# Altium footprint library PcbLib1.PcbLib: 1009 footprints (part 10 of 64)
Each footprint in its own frame and in the unit in brackets; x right, y up, seen from the top. Pads: shape width x height; smd on the part's side, far side on the other; paste and mask are expansions set on the pad; w line width, h text height; cw(c..) or ccw(c..) is an arc to the next point about the centre after c.
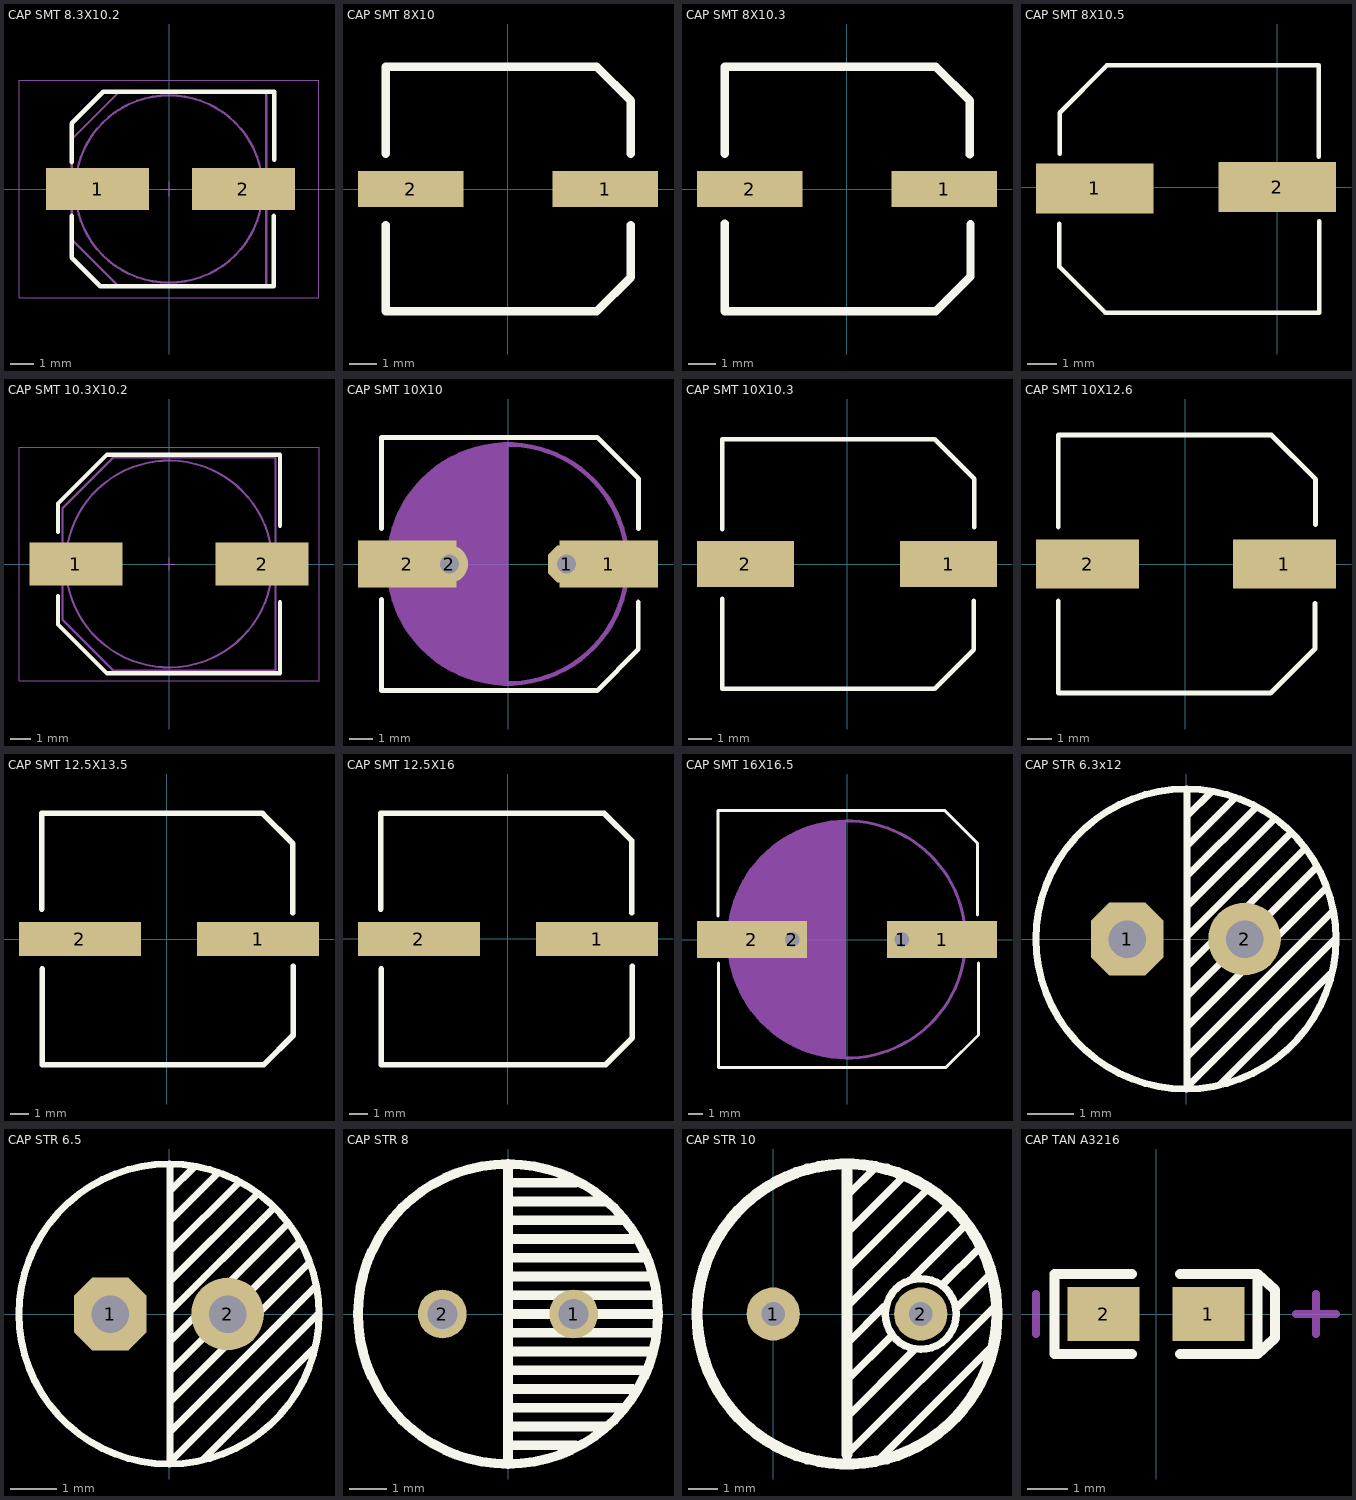
[diagram p9: the footprints below, top view; thin cyan lines are the x and y axes]

## CAP SMT 8.3X10.2 [mm] "Capacitor, Aluminium Electrolytric, 8.3mm L X 8.3mm W X 10.2mm H, IPC Medium Density"
height 10.2
pads (2):
  rect 4.4x1.8 smd: 1(-3.048,0) 2(3.175,0)
Top Overlay:
  lines w0.2: -4.15,-1.15 -4.15,-2.937 -2.937,-4.15 4.47,-4.15 4.47,-1.15 ; -4.15,1.15 -4.15,2.81 -2.81,4.15 4.496,4.15 4.496,1.25
Mechanical 14:
  circle w0.1: c0,0 r4
  lines w0.1: -4.15,-2.15 -4.15,2.124 -2.124,4.15 4.15,4.15 4.15,-4.15 -2.15,-4.15 -4.15,-2.15
Mechanical 15:
  lines w0.05: -0.3,0 0.3,0 ; 0,-0.3 0,0.3 ; -6.4,-4.65 6.4,-4.65 6.4,4.65 -6.4,4.65 -6.4,-4.65
3D body "p440-180.stp": height 0.02, standoff 0, extent 0.985,-0.9 5.385,0.9
3D body "p440-180.stp": height 0.02, standoff 0, extent -5.258,-0.9 -0.858,0.9
3D body "CAPAE830X1020N.stp": height 10.2, standoff 0, extent -4.75,-4.25 5.25,4.25

## CAP SMT 8X10 [mm]
pads (2):
  rect 3.8x1.3 smd: 1(3.5,0) 2(-3.5,0)
Top Overlay:
  lines w0.3: -4.4,-1.295 -4.4,-4.4 3.2,-4.4 4.42,-3.18 4.42,-1.295 ; -4.4,1.27 -4.4,4.4 3.2,4.4 4.42,3.18 4.42,1.27
3D body "3d_8x10-aecap.stp": height 10, standoff 0, extent -4.95,-4.2 4.95,4.2
3D body "p380-130.stp": height 0.02, standoff 0, extent 1.6,-0.65 5.4,0.65
3D body "p380-130.stp": height 0.02, standoff 0, extent -5.4,-0.65 -1.6,0.65

## CAP SMT 8X10.3 [mm]
pads (2):
  rect 3.8x1.3 smd: 1(3.5,0) 2(-3.5,0)
Top Overlay:
  lines w0.3: -4.4,-1.245 -4.4,-4.4 3.2,-4.4 4.445,-3.155 4.445,-1.27 ; -4.4,1.27 -4.4,4.4 3.2,4.4 4.42,3.18 4.42,1.245
3D body "p380-130.stp": height 0.02, standoff 0, extent -5.4,-0.65 -1.6,0.65
3D body "p380-130.stp": height 0.02, standoff 0, extent 1.6,-0.65 5.4,0.65
3D body "3d_8x10_3-aecap.stp": height 10.3, standoff 0, extent -4.9,-4.2 5,4.2

## CAP SMT 8X10.5 [mm]
pads (2):
  rect 4x1.7 smd: 1(-6.202,-0.042) 2(0,0)
Top Overlay:
  lines w0.15: -7.408,-1.238 -7.408,-2.701 -5.844,-4.265 1.429,-4.265 1.429,-1.164 ; -7.398,1.138 -7.398,2.534 -5.793,4.138 1.418,4.138 1.418,1.027
3D body "SL-H.STEP": height 10.5, standoff 0, extent -7.601,-4.197 1.399,4.103

## CAP SMT 10.3X10.2 [mm] "Capacitor, Aluminium Electrolytric, 10.3mm L X 10.3mm W X 10.2mm H, IPC Medium Density"
height 10.2
pads (2):
  rect 4.5x2.1 smd: 1(-4.5,0) 2(4.5,0)
Top Overlay:
  lines w0.2: -5.359,-1.55 -5.359,-2.921 -2.997,-5.283 5.359,-5.283 5.359,-1.85 ; -5.359,1.55 -5.359,2.921 -2.997,5.283 5.359,5.283 5.359,1.85
Mechanical 14:
  circle w0.1: c0,0 r5
  lines w0.1: -5.15,-2.7 -2.7,-5.15 5.15,-5.15 5.15,5.15 -2.7,5.15 -5.15,2.7 -5.15,-2.7
Mechanical 15:
  lines w0.05: -0.3,0 0.3,0 ; 0,-0.3 0,0.3 ; -7.25,-5.65 -7.25,5.65 7.25,5.65 7.25,-5.65 -7.25,-5.65
3D body "p450-210.stp": height 0.02, standoff 0, extent 2.25,-1.05 6.75,1.05
3D body "p450-210.stp": height 0.02, standoff 0, extent -6.75,-1.05 -2.25,1.05
3D body "CAPAE1030X1020N.stp": height 10.2, standoff 0, extent -6,-5.25 6,5.25

## CAP SMT 10X10 [mm]
height 3.8
pads (4):
  oct 1.6x1.6 hole 0.8 mask+0.051: 1(2.5,0)
  rect 4.2x2 smd: 1(4.3,0) 2(-4.3,0)
  round 1.6 hole 0.8 mask+0.051: 2(-2.5,0)
Top Overlay:
  lines w0.2: -5.4,-1.5 -5.4,-5.4 3.8,-5.4 5.56,-3.64 5.56,-1.62 ; -5.4,1.5 -5.4,5.4 3.8,5.4 5.57,3.63 5.57,1.51
Mechanical 15:
  circle w0.2: c0,0 r5.1
  region: 0.02,-5.1 0.02,5.12 -1.5,4.87 -2.85,4.28 -4.2,2.91 -4.88,1.43 -5.11,0.45 -5.05,-0.69 -4.61,-2.34 -3.49,-3.77 -2.03,-4.67 -1.02,-4.99
3D body "3d_10x10_3-aecap.stp": height 10.3, standoff 0, extent -6.01,-5.23 6.09,5.17
3D body "f2-4_2.stp": height 0.1, standoff 0, extent -6.43,-1.02 -2.23,0.98
3D body "f2-4_2.stp": height 0.1, standoff 0, extent 2.19,-0.99 6.39,1.01

## CAP SMT 10X10.3 [mm]
pads (2):
  rect 4.2x2 smd: 1(4.4,0) 2(-4.4,0)
Top Overlay:
  lines w0.2: -5.4,-1.5 -5.4,-5.4 3.8,-5.4 5.486,-3.714 5.486,-1.6 ; -5.4,1.5 -5.4,5.4 3.8,5.4 5.512,3.688 5.512,1.6
3D body "3d_10x10_3-aecap.stp": height 10.3, standoff 0, extent -6,-5.2 6.1,5.2
3D body "p420-200.stp": height 0.02, standoff 0, extent -6.5,-1 -2.3,1
3D body "p420-200.stp": height 0.02, standoff 0, extent 2.3,-1 6.5,1

## CAP SMT 10X12.6 [mm]
pads (2):
  rect 4.2x2 smd: 1(4.039,0) 2(-3.988,0)
Top Overlay:
  lines w0.2: -5.182,-1.5 -5.182,-5.258 3.48,-5.258 5.283,-3.454 5.283,-1.6 ; -5.182,1.5 -5.182,5.258 3.505,5.258 5.309,3.454 5.309,1.6
3D body "User Library-CAP SMD SVP 10_0x12_6.STEP": height 12.6, standoff 0, extent -5.475,-5.144 5.525,5.156

## CAP SMT 12.5X13.5 [mm]
pads (2):
  rect 6.5x1.8 smd: 1(4.877,0) 2(-4.623,0)
Top Overlay:
  lines w0.3: -6.655,1.6 -6.655,6.7 5.111,6.7 6.731,5.08 6.731,1.397 ; -6.629,-1.6 -6.629,-6.7 5.187,-6.7 6.756,-5.131 6.756,-1.448
3D body "p440-180.stp": height 0.02, standoff 0, extent -7.874,-0.9 -3.474,0.9
3D body "p440-180.stp": height 0.02, standoff 0, extent 3.744,-0.874 8.144,0.926
3D body "3d_12_5x16-aecap.stp": height 16.01, standoff 0, extent -7.89,-6.58 8.11,6.42

## CAP SMT 12.5X16 [mm]
pads (2):
  rect 6.5x1.8 smd: 1(4.775,-0.025) 2(-4.724,-0.025)
Top Overlay:
  lines w0.3: -6.756,1.575 -6.756,6.675 5.162,6.675 6.629,5.207 6.629,1.372 ; -6.731,-1.625 -6.731,-6.725 5.238,-6.725 6.655,-5.309 6.655,-1.473
3D body "3d_12_5x16-aecap.stp": height 16.01, standoff 0, extent -8,-6.5 8,6.5
3D body "p440-180.stp": height 0.02, standoff 0, extent 3.642,-0.9 8.042,0.9
3D body "p440-180.stp": height 0.02, standoff 0, extent -7.976,-0.925 -3.576,0.875

## CAP SMT 16X16.5 [mm]
height 3.8
pads (4):
  oct 2x2 hole 1 mask+0.051: 1(3.75,0)
  rect 7.5x2.5 smd: 1(6.5,0) 2(-6.5,0)
  round 2 hole 1 mask+0.051: 2(-3.75,0)
Top Overlay:
  lines w0.2: -8.82,1.6 -8.82,8.82 6.68,8.82 8.93,6.57 8.93,1.68 ; -8.77,-1.6 -8.77,-8.75 6.75,-8.75 8.98,-6.52 8.98,-1.61
Mechanical 15:
  circle w0.2: c0,0 r8.1
  region: -0.07,-8.11 -0.07,8.13 -2,7.84 -3.72,7.19 -5.27,6.16 -6.54,4.8 -7.43,3.33 -7.9,1.73 -8.13,0.25 -7.89,-1.95 -7.15,-3.76 -6.29,-5.09 -4.72,-6.65 -2.65,-7.66 -1.34,-8.01
3D body "3d_16x16_5-aecap.stp": height 16.51, standoff 0, extent -9.88,-8.49 10.12,8.51
3D body "f2_5-7_5.stp": height 0.1, standoff 0, extent -10.3,-1.22 -2.8,1.28
3D body "f2_5-7_5.stp": height 0.1, standoff 0, extent 2.74,-1.24 10.24,1.26

## CAP STR 6.3x12 [mil] "6.5mm(Dia.) x 12mm(Length) 2.5mm(Lead Spacing)"
height 472.44
pads (2):
  oct 62x62 hole 32: 1(-50,0)
  round 62 hole 32: 2(50,0)
Top Overlay:
  lines w6: -65,0 -30,0 ; 1,-128 1,128 ; 1,-126.3 127.65,0.35 ; 1,-100.6 124.3,22.7 ; 1,-74.9 118.95,43.05 ; 1,-49.2 110.6,60.4 ; 1,-23.5 101.25,76.75 ; 1,2.2 89.4,90.6 ; 1,27.9 75.55,102.45 ; 1,53.6 60.2,112.8 ; 1,79.3 42.35,120.65 ; 1,105 21.5,125.5 ; 29,-124 123,-30 ; -128,0 ccw(c0,0) 0,-128 ccw(c0,0) 128,0 ccw(c0,0) 0,128 ccw(c0,0) -128,0
3D body "User Library-Cap electro 6_3x12_5x2_5mm.STEP": height 512.81, standoff -118.67, extent -125,-126.01 125.03,124.01

## CAP STR 6.5 [mil] "6.5mm(Dia.) x 11.5mm(Length) 2.5mm(Lead Spacing)"
height 452.76
pads (2):
  oct 62x62 hole 32: 1(-50,0)
  round 62 hole 32: 2(50,0)
Top Overlay:
  lines w6: -65,0 -30,0 ; 1,-128 1,128 ; 1,-126.3 127.65,0.35 ; 1,-100.6 124.3,22.7 ; 1,-74.9 118.95,43.05 ; 1,-49.2 110.6,60.4 ; 1,-23.5 101.25,76.75 ; 1,2.2 89.4,90.6 ; 1,27.9 75.55,102.45 ; 1,53.6 60.2,112.8 ; 1,79.3 42.35,120.65 ; 1,105 21.5,125.5 ; 29,-124 123,-30 ; -128,0 ccw(c0,0) 0,-128 ccw(c0,0) 128,0 ccw(c0,0) 0,128 ccw(c0,0) -128,0
3D body "Radial Capacitor 6.3mm(D) x 11mm(L) 2.5 mm lead spacing.STEP": height 433.07, standoff -748.03, extent -123.03,-124.02 125,124.01

## CAP STR 8 [mm] "8*12  470uF/25V"
height 12
pads (2):
  round 1.3 / inner round 1.3 / far side round 1.5 hole 0.8: 1(1.75,0) 2(-1.75,0)
Top Overlay:
  circle w0.254: c0,0 r4
  lines w0.254: 0,-3.9 0,3.9 ; 0,-3.5 1.802,-3.5 ; 0,-3 2.564,-3 ; 0,-2.5 3.072,-2.5 ; 0,-2 3.326,-2 ; 0,-1.5 3.58,-1.5 ; 0,-1 3.834,-1 ; 0,-0.5 3.834,-0.5 ; 0,0 4,0 ; 0,0.5 3.834,0.5 ; 0,1 3.834,1 ; 0,1.5 3.58,1.5 ; 0,2 3.326,2 ; 0,2.5 3.072,2.5 ; 0,3 2.564,3 ; 0,3.5 1.802,3.5
3D body "SW3dPS-Cap electro 8x11.5x3.5mm.STEP": height 11.83, standoff -3.68, extent -4.025,-4.025 4.026,4.026

## CAP STR 10 [mm]
pads (2):
  round 1.8 hole 0.8: 1(0,0) 2(5,0)
Top Overlay:
  circle w0.254: c5,0 r1.2
  circle w0.381: c2.5,0 r5.08
  lines w0.254: 2.5,-4.75 7.5,0.25 ; 2.5,-3.5 4.75,-1.25 ; 2.5,-2.25 4,-0.75 ; 2.5,-1 3.75,0.25 ; 2.5,0.25 6,3.75 ; 2.5,1.5 5.25,4.25 ; 2.5,4 3.5,5 ; 2.625,2.875 4.5,4.75 ; 3.5,-5 7.5,-1 ; 4.75,1.25 6.5,3 ; 5.75,1 7,2.25 ; 6.25,0.25 7.25,1.25 ; 7.371,-1.589 7.4,-1.425
  lines w0.381: 2.5,-4.75 2.5,4.826
3D body "User Library-Cap electro 10x16x5_0mm.STEP": height 16.53, standoff -3.74, extent -2.551,-5 7.5,5.051

## CAP TAN A3216 [mm]
pads (2):
  rect 1.8x1.35 smd: 1(1.31,0) 2(-1.31,0)
Top Overlay:
  lines w0.254: -0.6,-1.002 -2.537,-1.002 -2.537,1.002 -0.6,1.002 ; 0.6,-1.002 2.537,-1.002 ; 0.6,1.002 2.537,1.002 ; 2.537,-1.002 2.537,1.002 ; 2.537,-1.002 2.973,-0.6 2.973,0.6 2.537,1.002
Mechanical 15:
  lines w0.203: -3,-0.5 -3,0.5 ; 3.5,0 4.5,0 ; 4,-0.5 4,0.5
3D body "User Library-AVX_ACASE.STEP": height 1.71, standoff 0, extent -1.7,-0.84 1.7,0.84